# Altium footprint library 布洛电子PCB封装库-电阻电容电感.PcbLib: 59 footprints (part 2 of 4)
Each footprint in its own frame and in the unit in brackets; x right, y up, seen from the top. Pads: shape width x height; smd on the part's side, far side on the other; paste and mask are expansions set on the pad; w line width, h text height; cw(c..) or ccw(c..) is an arc to the next point about the centre after c.
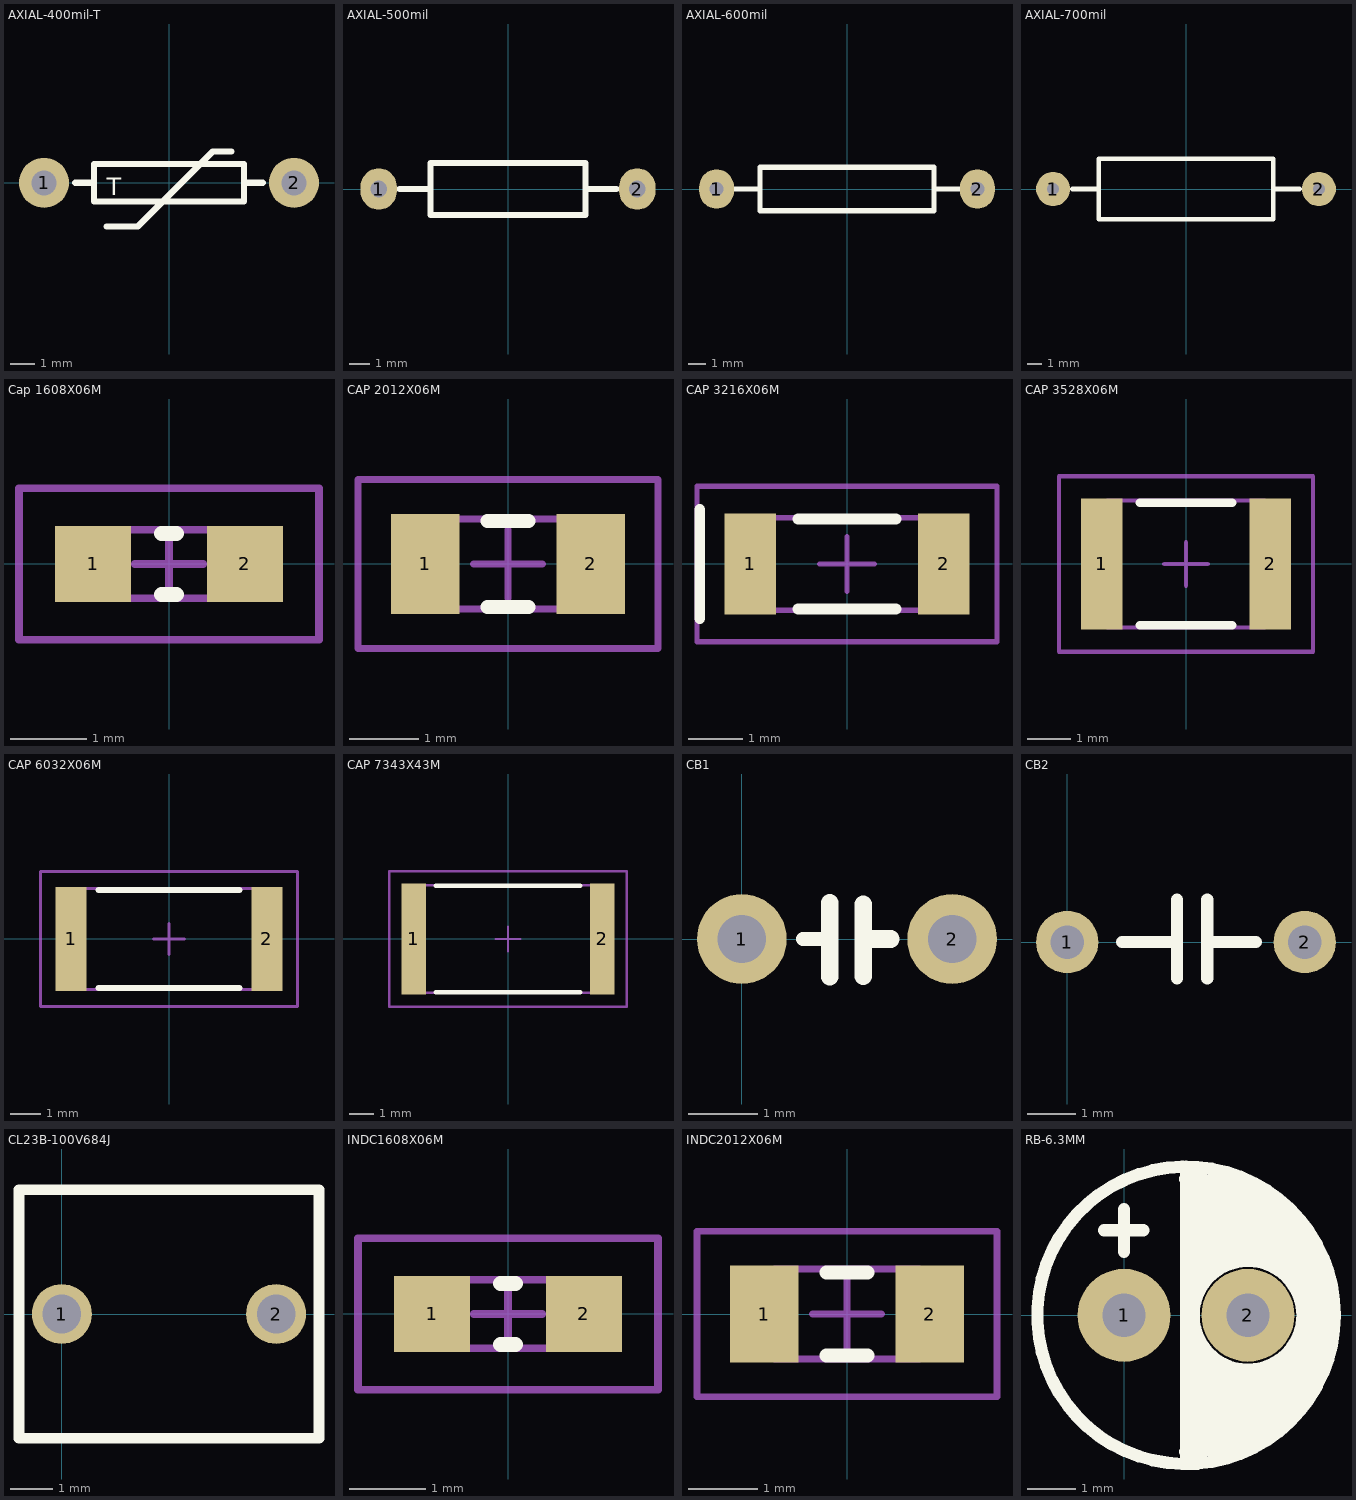
[diagram p1: the footprints below, top view; thin cyan lines are the x and y axes]

## AXIAL-400mil-T [mil]
pads (2):
  round 80 hole 40: 1(-200,0) 2(200,0)
Top Overlay:
  lines w10: -150,0 -120,0 ; -100,-70 -50,-70 70,50 100,50 ; 120,0 150,0 ; -120,-30 -120,30 120,30 120,-30 -120,-30
  text "T" at -100,-20 h28

## AXIAL-500mil [mil]
pads (2):
  oval 70x80 hole 32: 1(-250,0) 2(250,0)
Top Overlay:
  lines w12: -210,0 -150,0 ; 150,0 210,0 ; -150,-50 -150,50 150,50 150,-50 -150,-50

## AXIAL-600mil [mil]
pads (2):
  oval 80x90 hole 32: 1(-300,0) 2(300,0)
Top Overlay:
  lines w12: -260,0 -200,0 ; 200,0 260,0 ; -200,-50 -200,50 200,50 200,-50 -200,-50

## AXIAL-700mil [mil]
pads (2):
  round 90 hole 32: 1(-350,0) 2(350,0)
Top Overlay:
  lines w12: -300,0 -230,0 ; 230,0 300,0 ; -230,-80 -230,80 230,80 230,-80 -230,-80

## Cap 1608X06M [mm] "Chip Capacitor, 2-Leads, Body 1.6x0.8mm, IPC Low Density"
height 0.6
pads (2):
  rect 1x1 smd: 1(-1,0) 2(1,0)
Top Overlay:
  lines w0.2: -0.1,-0.4 0.1,-0.4 ; -0.1,0.4 0.1,0.4
Mechanical 13:
  lines w0.1: -0.85,-0.45 0.85,-0.45 0.85,0.45 -0.85,0.45 -0.85,-0.45
Mechanical 15:
  lines w0.1: -0.45,0 0.45,0 ; 0,-0.45 0,0.45 ; -1.975,-1 1.975,-1 1.975,1 -1.975,1 -1.975,-1
3D body: height 0.55, standoff 0, extent -0.8,-0.4 0.8,0.4

## CAP 2012X06M [mm] "Chip Capacitor, 2-Leads, Body 2.0x1.2mm, IPC Low Density"
height 0.6
pads (2):
  rect 1x1.45 smd: 1(-1.2,0) 2(1.2,0)
Top Overlay:
  lines w0.2: -0.3,-0.625 0.3,-0.625 ; -0.3,0.625 0.3,0.625
Mechanical 13:
  lines w0.1: -1.05,-0.65 -1.05,0.65 1.05,0.65 1.05,-0.65 -1.05,-0.65
Mechanical 15:
  lines w0.1: -0.5,0 0.5,0 ; 0,-0.5 0,0.5 ; -2.175,-1.225 -2.175,1.225 2.175,1.225 2.175,-1.225 -2.175,-1.225
3D body: height 1, standoff 0, extent -1,-0.6 1,0.6

## CAP 3216X06M [mm] "Chip Capacitor, 2-Leads, Body 3.2x1.6mm, IPC Low Density"
height 0.6
pads (2):
  rect 0.95x1.85 smd: 1(-1.775,0) 2(1.775,0)
Top Overlay:
  lines w0.2: -2.7,-1 -2.7,1 ; -0.9,-0.825 0.9,-0.825 ; -0.9,0.825 0.9,0.825
Mechanical 13:
  lines w0.1: -1.65,-0.85 1.65,-0.85 1.65,0.85 -1.65,0.85 -1.65,-0.85
Mechanical 15:
  lines w0.1: -0.5,0 0.5,0 ; 0,-0.5 0,0.5 ; -2.75,-1.425 2.75,-1.425 2.75,1.425 -2.75,1.425 -2.75,-1.425
3D body: height 1.8, standoff 0, extent -1.742,-0.902 1.775,0.902

## CAP 3528X06M [mm] "Chip Capacitor, 2-Leads, Body 3.5x2.8mm, IPC Low Density"
height 0.6
pads (2):
  rect 0.95x3 smd: 1(-1.925,0) 2(1.925,0)
Top Overlay:
  lines w0.2: -1.05,-1.4 1.05,-1.4 ; -1.05,1.4 1.05,1.4
Mechanical 13:
  lines w0.1: -1.8,-1.45 1.8,-1.45 1.8,1.45 -1.8,1.45 -1.8,-1.45
Mechanical 15:
  lines w0.1: -0.5,0 0.5,0 ; 0,-0.5 0,0.5 ; -2.9,-2 2.9,-2 2.9,2 -2.9,2 -2.9,-2
3D body: height 2.11, standoff 0, extent -1.925,-1.499 2.029,1.499

## CAP 6032X06M [mm] "Chip Capacitor, 2-Leads, Body 6.0x3.2mm, IPC Low Density"
height 0.6
pads (2):
  rect 1x3.4 smd: 1(-3.2,0) 2(3.2,0)
Top Overlay:
  lines w0.2: -2.3,-1.6 2.3,-1.6 ; -2.3,1.6 2.3,1.6
Mechanical 13:
  lines w0.1: -3.05,-1.65 -3.05,1.65 3.05,1.65 3.05,-1.65 -3.05,-1.65
Mechanical 15:
  lines w0.1: -0.5,0 0.5,0 ; 0,-0.5 0,0.5 ; -4.2,-2.2 -4.2,2.2 4.2,2.2 4.2,-2.2 -4.2,-2.2
3D body: height 2.79, standoff 0, extent -3.361,-1.756 3.2,1.756

## CAP 7343X43M [mm] "Chip Capacitor, 2-Leads, Body 7.3x4.3mm, IPC Low Density"
height 4.3
pads (2):
  rect 1x4.55 smd: 1(-3.85,0) 2(3.85,0)
Top Overlay:
  lines w0.2: -2.95,-2.175 2.95,-2.175 ; -2.95,2.175 2.95,2.175
Mechanical 13:
  lines w0.1: -3.7,-2.2 -3.7,2.2 3.7,2.2 3.7,-2.2 -3.7,-2.2
Mechanical 15:
  lines w0.1: -0.5,0 0.5,0 ; 0,-0.5 0,0.5 ; -4.85,-2.775 -4.85,2.775 4.85,2.775 4.85,-2.775 -4.85,-2.775
3D body: height 3.1, standoff 0, extent -4.012,-2.305 3.85,2.305

## CB1 [mm]
pads (2):
  round 1.3 hole 0.7: 1(0,0) 2(3.048,0)
Top Overlay:
  lines w0.203: 0.889,0 1.143,0
  lines w0.254: 1.271,0.522 1.272,-0.546 ; 1.757,-0.54 1.757,0.504 ; 1.778,0 2.159,0

## CB2 [mm]
pads (2):
  round 1.3 hole 0.7: 1(0,0) 2(4.953,0)
Top Overlay:
  lines w0.254: 1.143,0 1.27,0 2.286,0 ; 2.286,-0.762 2.286,0.889 ; 2.921,-0.762 2.921,0.889 ; 3.048,0 3.937,0

## CL23B-100V684J [mm] "校正电容"
pads (2):
  round 1.4 hole 0.9: 1(0,0) 2(5,0)
Top Overlay:
  lines w0.254: -1,0 -1,2.9 0,2.9 ; -1,0.254 -1,-2.9 0,-2.9 5.355,-2.9 ; -0.33,2.9 5,2.9 ; 3.81,2.9 6,2.9 6,0 ; 5,-2.9 6,-2.9 6,0.914
3D body: height 11, standoff 0, extent -1.016,-2.921 5.994,2.921

## INDC1608X06M [mm] "Chip Inductor, 2-Leads, Body 1.6x0.8mm, IPC Low Density"
height 0.6
pads (2):
  rect 1x1 smd: 1(-1,0) 2(1,0)
Top Overlay:
  lines w0.2: -0.1,-0.4 0.1,-0.4 ; -0.1,0.4 0.1,0.4
Mechanical 13:
  lines w0.1: -0.85,-0.45 -0.85,0.45 0.85,0.45 0.85,-0.45 -0.85,-0.45
Mechanical 15:
  lines w0.1: -0.45,0 0.45,0 ; 0,-0.45 0,0.45 ; -1.975,-1 -1.975,1 1.975,1 1.975,-1 -1.975,-1
3D body: height 0.55, standoff 0, extent -0.8,-0.4 0.8,0.4

## INDC2012X06M [mm] "Chip Inductor, 2-Leads, Body 2.0x1.2mm, IPC Low Density"
height 0.6
pads (2):
  rect 1x1.4 smd: 1(-1.2,0) 2(1.2,0)
Top Overlay:
  lines w0.2: -0.3,-0.6 0.3,-0.6 ; -0.3,0.6 0.3,0.6
Mechanical 13:
  lines w0.1: -1.05,-0.65 1.05,-0.65 1.05,0.65 -1.05,0.65 -1.05,-0.65
Mechanical 15:
  lines w0.1: -0.5,0 0.5,0 ; 0,-0.5 0,0.5 ; -2.175,-1.2 2.175,-1.2 2.175,1.2 -2.175,1.2 -2.175,-1.2
3D body: height 1, standoff 0, extent -1,-0.6 1,0.6

## RB-6.3MM [mil]
pads (2):
  round 75 hole 35: 1(0,0) 2(100,0)
Top Overlay:
  circle w12: c100,0 r45
  circle w10: c50,0 r120
  circle w10: c100,0 r45
  lines w10: -16.14,68.5 15.35,68.5 ; 0,51.18 0,85.43 ; 50,-120 50,120 ; 50,-105 ccw(c50,0) 155,0 ccw(c55,0) 55,100 ; 50,-95 ccw(c55,0) 150,-5 ; 50,-75 ccw(c70,-60) 85,-80 ccw(c90,-60) 110,-65 ; 50,45 cw(c57.5,42.5) 60,50 ; 50,65 ccw(c47.5,72.5) 55,75 ; 50,90 cw(c57.5,-2.5) 150,5 ; 50,95 ccw(c57.5,107.5) 70,100 ; 55,-85 ccw(c62.5,-82.5) 65,-90 ; 55,-70 ccw(c70,-60) 80,-75 ; 55,-60 ccw(c72.5,-52.5) 80,-70 ccw(c85,-55) 100,-60 ; 55,-50 ccw(c75,-45) 80,-65 ; 55,-40 ccw(c82.5,-27.5) 95,-55 ; 55,-25 ccw(c92.5,-12.5) 105,-50 ccw(c112.5,-22.5) 140,-30 ; 55,25 cw(c87.5,17.5) 95,50 ; 55,40 cw(c82.5,27.5) 95,55 ; 55,55 ccw(c47.5,72.5) 65,80 cw(c75,60) 95,70 ; 55,60 ccw(c50,70) 60,75 ; 55,80 ccw(c55,85) 60,85 ; 60,30 cw(c77.5,27.5) 80,45 ; 65,60 cw(c77.5,52.5) 85,65 cw(c92.5,47.5) 110,55 ; 65,75 cw(c75,65) 85,75 ; 70,55 cw(c87.5,37.5) 105,55 ; 70,70 cw(c80,60) 90,70 ; 85,-85 ccw(c90,-55) 120,-60 ; 85,-75 ccw(c87.5,-57.5) 105,-60 ; 85,-65 ccw(c87.5,-57.5) 95,-60 ; 85,70 cw(c95,40) 125,50 ; 100,-55 ccw(c112.5,-37.5) 130,-50 ; 100,50 cw(c110,20) 140,30 ; 115,55 ccw(c112.5,57.5) 115,60
  lines w11: 50,-110 ccw(c50,0) 160,0 ccw(c50,0) 50,110
3D body: height 453.76, standoff -128.81, extent -49.42,-99.42 149.43,99.43